# Altium footprint library Team Starcraft.PcbLib: 62 footprints (part 4 of 4)
Each footprint in its own frame and in the unit in brackets; x right, y up, seen from the top. Pads: shape width x height; smd on the part's side, far side on the other; paste and mask are expansions set on the pad; w line width, h text height; cw(c..) or ccw(c..) is an arc to the next point about the centre after c.
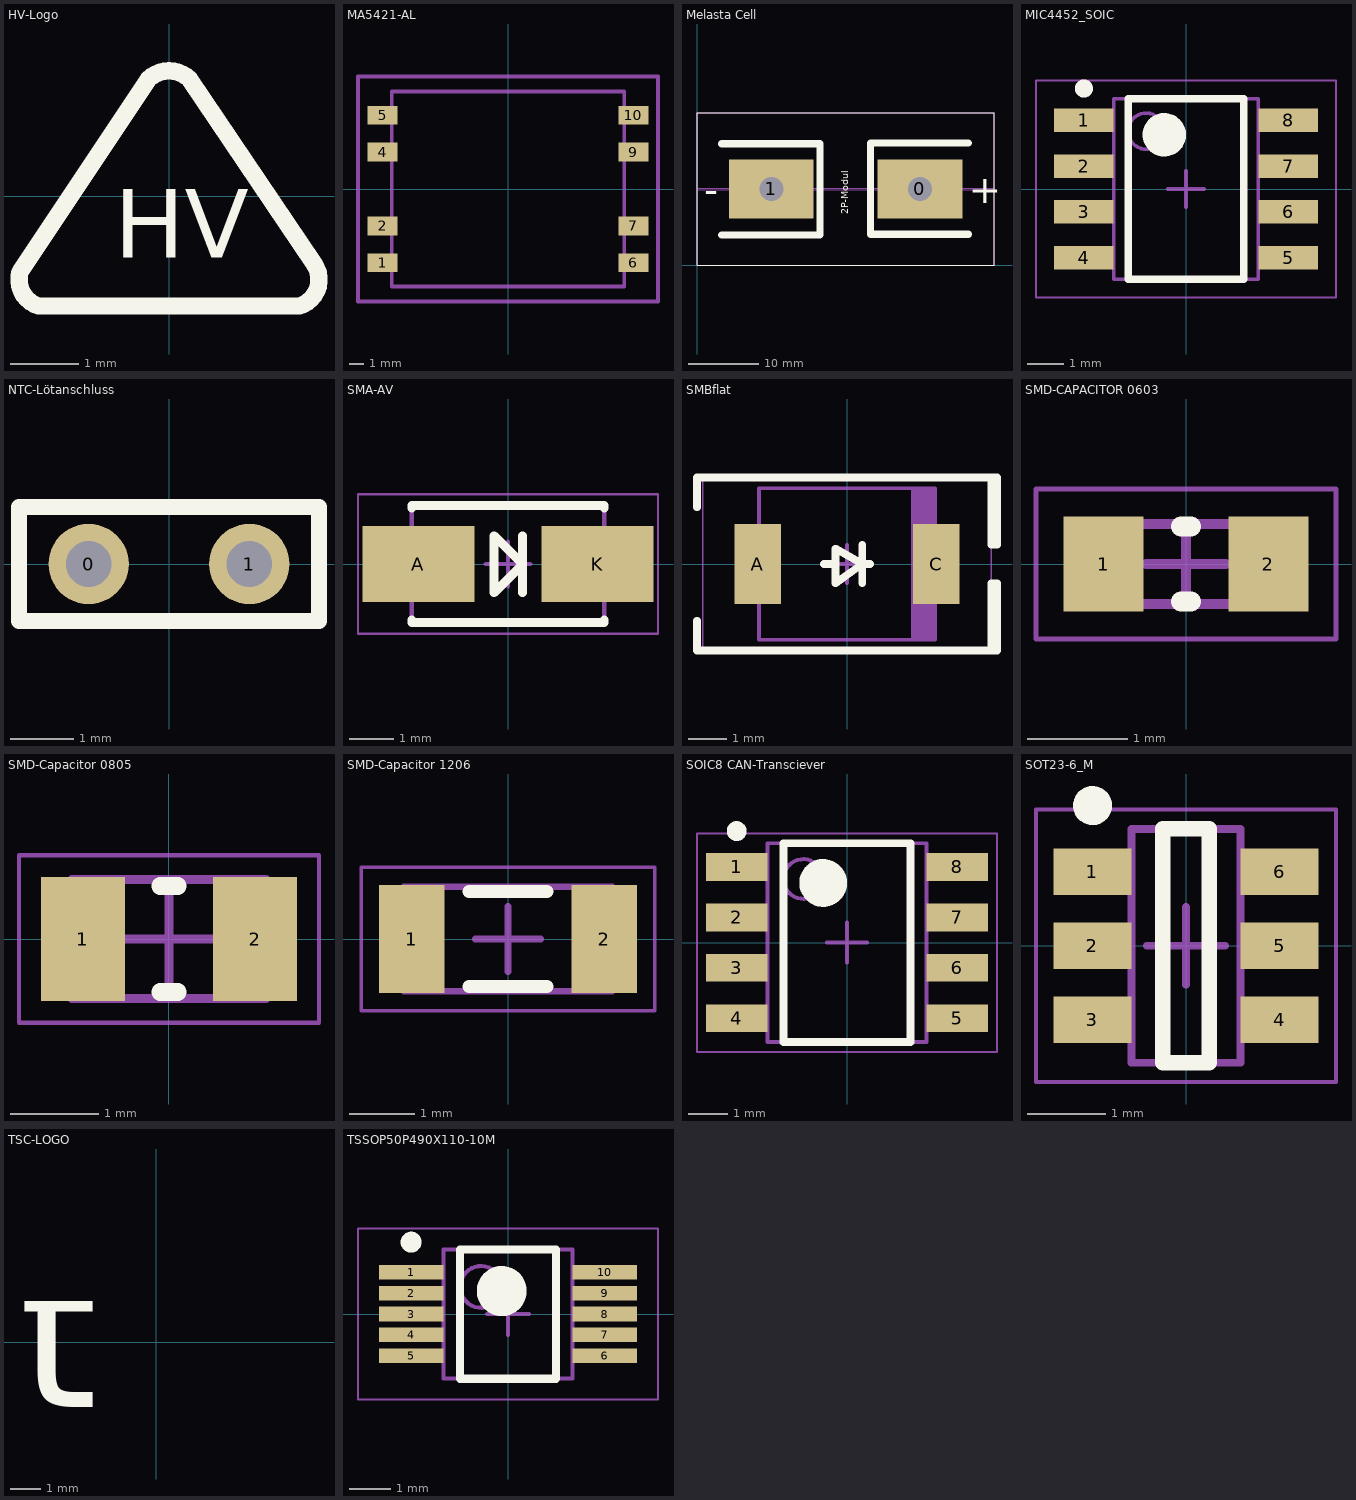
[diagram p3: the footprints below, top view; thin cyan lines are the x and y axes]

## HV-Logo [mm]
Top Overlay:
  lines w0.254: -2.167,-1.1 ccw(c-1.783,-1.217) -1.9,-1.6 1.9,-1.6 ccw(c1.783,-1.217) 2.114,-0.99 0.3,1.7 ccw(c0,1.4) -0.3,1.7 -2.167,-1.1
  text "HV" at -0.8,-0.9 h1

## MA5421-AL [mm] "Coilcraft MA5421-AL"
pads (8):
  rect 2x1.27 smd: 1(-8.5,-5) 2(-8.5,-2.5) 4(-8.5,2.5) 5(-8.5,5) 6(8.5,-5) 7(8.5,-2.5) 9(8.5,2.5) 10(8.5,5)
Mechanical 13:
  lines w0.254: -7.874,-6.604 -7.874,6.604 -7.366,6.604 7.874,6.604 7.874,-6.604 -7.874,-6.604
Mechanical 15:
  lines w0.254: -10.16,-7.62 10.16,-7.62 10.16,7.62 -10.16,7.62 -10.16,-7.62
3D body "Coilcraft-MA5421-AL.STEP": height 12.67, standoff -0.03, extent -8.88,-6.73 8.88,6.73

## Melasta Cell [mm] "Melasta SLPBXX-Cell for TSC-5E"
pads (2):
  rect 12x8.4 hole 3.4: 0(31.5,10.8) 1(10.5,10.8)
Top Overlay:
  lines w0.1: 0,0 0,21.6 42,21.6 42,0 0,0
  lines w1: 3.5,4.3 17.4,4.3 17.4,17.2 3.5,17.2 ; 38.4,4.4 24.5,4.4 24.5,17.3 38.4,17.3
  text "2P-Modul" at 21.4,7.2 h1
  text "-" at 1,8.8 h4
  text "+" at 38.4,8.8 h4
Mechanical 15:
  lines w0.1: 0,0 42,0 42,10.7 0,10.7 0,0 ; 0,10.9 0,21.6 42,21.6 42,10.9 0,10.9

## MIC4452_SOIC [mm] "SOIC, 8-Leads, Body 4,90x3,90mm, Pitch 1,27mm, IPC Low Density"
height 1.63
pads (8):
  rect 1.65x0.65 smd: 1(-2.825,1.905) 2(-2.825,0.635) 3(-2.825,-0.635) 4(-2.825,-1.905) 5(2.825,-1.905) 6(2.825,-0.635) 7(2.825,0.635) 8(2.825,1.905)
Top Overlay:
  circle w0.25: c-2.825,2.78 r0.125
  circle w0.6: c-0.6,1.5 r0.3
  lines w0.2: -1.6,-2.5 -1.6,2.5 1.6,2.5 1.6,-2.5 -1.6,-2.5
Mechanical 13:
  circle w0.1: c-1.1,1.6 r0.5
  lines w0.1: -2,-2.5 -2,2.5 2,2.5 2,-2.5 -2,-2.5
Mechanical 15:
  lines w0.05: -4.15,-3 -4.15,3 4.15,3 4.15,-3 -4.15,-3
  lines w0.1: -0.5,0 0.5,0 ; 0,-0.5 0,0.5
3D body "MIC4452_SOIC.step": height 1.63, standoff 0.01, extent -2.99,-2.5 2.99,2.5

## NTC-Lötanschluss [mm] "für die Zelltemperatur"
pads (2):
  round 1.27 hole 0.72: 0(-1.27,0) 1(1.27,0)
Top Overlay:
  lines w0.254: -2.37,-0.9 2.37,-0.9 2.37,0.9 -2.37,0.9 -2.37,-0.9
Bottom Overlay:
  lines w0.254: -2.37,-0.9 2.37,-0.9 2.37,0.9 -2.37,0.9 -2.37,-0.9

## SMA-AV [mm] "SMA, 2-Leads, Body 4.3x2.605mm"
height 2.4
pads (2):
  rect 2.5x1.7 smd: A(-2,0) K(2,0)
Top Overlay:
  lines w0.2: -2.15,-1.302 2.15,-1.302 ; -2.15,-1.302 -2.15,-1.25 ; -2.15,1.25 -2.15,1.302 ; -2.15,1.302 2.15,1.302 ; 0.327,-0.639 0.327,0.631 ; 2.15,-1.302 2.15,-1.25 ; 2.15,1.25 2.15,1.302 ; -0.308,-0.639 0.327,-0.004 -0.308,0.631 -0.308,-0.639
Mechanical 13:
  lines w0.1: -2.15,-1.302 2.15,-1.302 2.15,1.302 -2.15,1.302 -2.15,-1.302
Mechanical 15:
  lines w0.05: -3.35,-1.56 3.35,-1.56 3.35,1.56 -3.35,1.56 -3.35,-1.56
  lines w0.1: -0.5,0 0.5,0 ; 0,-0.5 0,0.5
3D body "DIOM4326X24L.step": height 2.4, standoff 0, extent -2.52,-1.46 2.52,1.46

## SMBflat [mm] "Molded Diode, 2-Leads, Body 5.1x3.3mm, IPC Medium Density"
height 1.1
pads (2):
  rect 1.2x2.07 smd: A(-2.32,0) C(2.32,0)
Top Overlay:
  lines w0.2: -3.9,-1.475 -3.9,-2.25 3.9,-2.25 3.9,-0.5 3.75,-0.5 3.75,-2.25 ; -3.9,1.475 -3.9,2.25 3.9,2.25 3.9,0.5 3.75,0.5 3.75,2.25 ; -0.6,0 -0.3,0 ; 0.4,-0.5 0.4,0.5 ; 0.6,0 0.4,0 ; 0.4,0 -0.3,0.4 -0.3,-0.5 0.4,0
Mechanical 13:
  rectangle: 1.67,-1.97 2.285,1.97
  lines w0.1: -2.285,-1.97 2.285,-1.97 2.285,1.97 -2.285,1.97 -2.285,-1.97
Mechanical 15:
  lines w0.05: -3.75,-2.25 3.75,-2.25 3.75,2.25 -3.75,2.25 -3.75,-2.25
  lines w0.1: -0.5,0 0.5,0 ; 0,-0.5 0,0.5
3D body "SMB.STEP": height 2.4, standoff 0, extent -2.6,-1.799 2.6,1.8

## SMD-CAPACITOR 0603 [mm] "Chip Capacitor, 0603"
height 0.8
pads (2):
  rect 0.8x0.95 smd: 1(-0.825,0) 2(0.825,0)
Top Overlay:
  lines w0.2: -0.05,-0.375 0.05,-0.375 ; -0.05,0.375 0.05,0.375
Mechanical 13:
  lines w0.1: -0.8,-0.4 -0.8,0.4 0.8,0.4 0.8,-0.4 -0.8,-0.4
Mechanical 15:
  lines w0.05: -1.5,-0.75 -1.5,0.75 1.5,0.75 1.5,-0.75 -1.5,-0.75
  lines w0.1: -0.4,0 0.4,0 ; 0,-0.4 0,0.4
3D body "CAPC1608X08N.step": height 0.8, standoff 0, extent -0.8,-0.4 0.8,0.4

## SMD-Capacitor 0805 [mm] "Chip Capacitor, 0805"
height 1.4
pads (2):
  rect 0.95x1.4 smd: 1(-0.975,0) 2(0.975,0)
Top Overlay:
  lines w0.2: -0.1,-0.6 0.1,-0.6 ; -0.1,0.6 0.1,0.6
Mechanical 13:
  lines w0.1: -1.1,-0.675 -1.1,0.675 1.1,0.675 1.1,-0.675 -1.1,-0.675
Mechanical 15:
  lines w0.05: -1.7,-0.95 -1.7,0.95 1.7,0.95 1.7,-0.95 -1.7,-0.95
  lines w0.1: -0.5,0 0.5,0 ; 0,-0.5 0,0.5
3D body "SMD-Capacitor.step": height 1.4, standoff 0, extent -1.1,-0.675 1.1,0.675

## SMD-Capacitor 1206 [mm] "Chip Capacitor, 1206"
height 1.4
pads (2):
  rect 1x1.65 smd: 1(-1.475,0) 2(1.475,0)
Top Overlay:
  lines w0.2: -0.6,-0.725 0.6,-0.725 ; -0.6,0.725 0.6,0.725
Mechanical 13:
  lines w0.1: -1.6,-0.8 -1.6,0.8 1.6,0.8 1.6,-0.8 -1.6,-0.8
Mechanical 15:
  lines w0.05: -2.25,-1.1 -2.25,1.1 2.25,1.1 2.25,-1.1 -2.25,-1.1
  lines w0.1: -0.5,0 0.5,0 ; 0,-0.5 0,0.5
3D body "SMD-Capacitor 1206.step": height 1.4, standoff 0, extent -1.6,-0.8 1.6,0.8

## SOIC8 CAN-Transciever [mm] "SOIC, 8-Leads, Body 4,90x4,00mm, Pitch 1,27mm, IPC Medium Density"
height 1.75
pads (8):
  rect 1.55x0.7 smd: 1(-2.775,1.905) 2(-2.775,0.635) 3(-2.775,-0.635) 4(-2.775,-1.905) 5(2.775,-1.905) 6(2.775,-0.635) 7(2.775,0.635) 8(2.775,1.905)
Top Overlay:
  circle w0.6: c-0.6,1.5 r0.3
  circle w0.25: c-2.775,2.805 r0.125
  lines w0.2: -1.6,-2.5 1.6,-2.5 1.6,2.5 -1.6,2.5 -1.6,-2.5
Mechanical 13:
  circle w0.1: c-1.1,1.6 r0.5
  lines w0.1: -2,-2.5 2,-2.5 2,2.5 -2,2.5 -2,-2.5
Mechanical 15:
  lines w0.05: -3.775,-2.75 3.775,-2.75 3.775,2.75 -3.775,2.75 -3.775,-2.75
  lines w0.1: -0.5,0 0.5,0 ; 0,-0.5 0,0.5
3D body "SOIC8 CAN-Transciever.step": height 1.75, standoff 0, extent -3.1,-2.5 3.1,2.5

## SOT23-6_M [mm]
height 1.1
pads (6):
  rect 1x0.6 smd: 1(-1.2,0.95) 2(-1.2,0) 3(-1.2,-0.95) 4(1.2,-0.95) 5(1.2,0) 6(1.2,0.95)
Top Overlay:
  circle w0.25: c-1.2,1.8 r0.125
  lines w0.2: -0.3,-1.5 -0.3,1.5 0.3,1.5 0.3,-1.5 -0.3,-1.5
Mechanical 13:
  lines w0.1: -0.7,-1.5 0.7,-1.5 0.7,1.5 -0.7,1.5 -0.7,-1.5
Mechanical 15:
  lines w0.05: -1.925,-1.75 1.925,-1.75 1.925,1.75 -1.925,1.75 -1.925,-1.75
  lines w0.1: -0.5,0 0.5,0 ; 0,-0.5 0,0.5
3D body "SOT23-6_M.step": height 1.1, standoff 0, extent -1.3,-1.5 1.3,1.5

## TSC-LOGO [mm]
Top Overlay:
  text "t" at -4.572,-4.064 h10

## TSSOP50P490X110-10M [mm] "TSSOP, 10-Leads, Body 3,00x3,00mm, Pitch 0,50mm, IPC Low Density"
height 1.1
pads (10):
  rect 1.55x0.35 smd: 1(-2.325,1) 2(-2.325,0.5) 3(-2.325,0) 4(-2.325,-0.5) 5(-2.325,-1) 6(2.325,-1) 7(2.325,-0.5) 8(2.325,0) 9(2.325,0.5) 10(2.325,1)
Top Overlay:
  circle w0.25: c-2.325,1.725 r0.125
  circle w0.6: c-0.15,0.55 r0.3
  lines w0.2: -1.15,-1.55 -1.15,1.55 1.15,1.55 1.15,-1.55 -1.15,-1.55
Mechanical 13:
  circle w0.1: c-0.65,0.65 r0.5
  lines w0.1: -1.55,-1.55 -1.55,1.55 1.55,1.55 1.55,-1.55 -1.55,-1.55
Mechanical 15:
  lines w0.05: -3.6,-2.05 -3.6,2.05 3.6,2.05 3.6,-2.05 -3.6,-2.05
  lines w0.1: -0.5,0 0.5,0 ; 0,-0.5 0,0.5
3D body "TSSOP50P490X110-10M.step": height 1.1, standoff 0, extent -2.45,-1.55 2.45,1.55